# Altium footprint library Footprints.PcbLib: 67 footprints (part 2 of 5)
Each footprint in its own frame and in the unit in brackets; x right, y up, seen from the top. Pads: shape width x height; smd on the part's side, far side on the other; paste and mask are expansions set on the pad; w line width, h text height; cw(c..) or ccw(c..) is an arc to the next point about the centre after c.
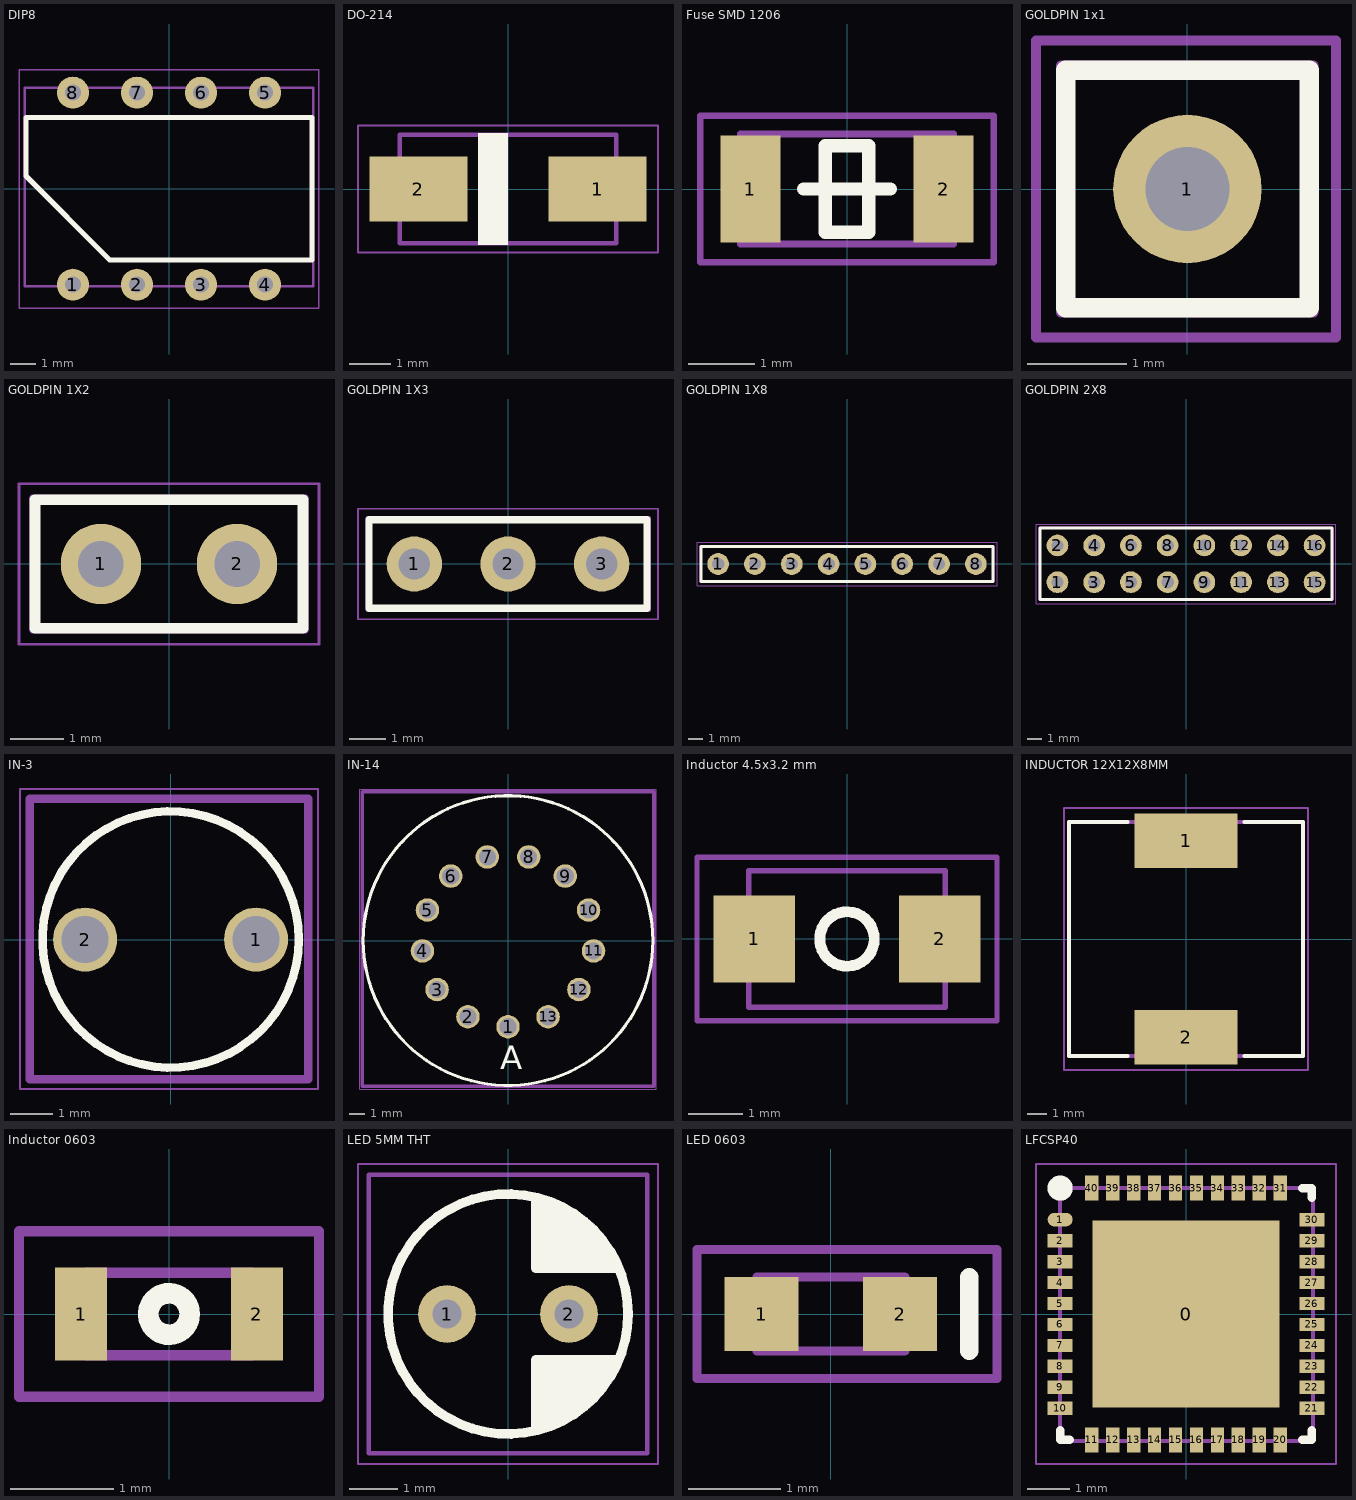
[diagram p1: the footprints below, top view; thin cyan lines are the x and y axes]

## DIP8 [mm]
pads (8):
  round 1.27 hole 0.635: 1(-3.81,-3.81) 2(-1.27,-3.81) 3(1.27,-3.81) 4(3.81,-3.81) 5(3.81,3.81) 6(1.27,3.81) 7(-1.27,3.81) 8(-3.81,3.81)
Top Overlay:
  lines w0.2: -5.675,0.5 -2.35,-2.825 5.675,-2.825 5.675,2.825 -5.675,2.825 -5.675,0.5
Placement:
  lines w0.1: -5.725,-3.875 -5.725,4 5.725,4 5.725,-3.875 -5.725,-3.875
  text "'.Designator'" at -4.8,0.6 h1.2
Keep-Out:
  lines w0.05: -5.95,-4.75 5.95,-4.75 5.95,4.725 -5.95,4.725 -5.95,-4.75
3D body "CircuitWorks-DIP8.step": height 4.19, standoff -2.67, extent -5.715,-3.874 5.715,4

## DO-214 [mm]
pads (2):
  rect 2.35x1.55 smd: 1(2.15,0) 2(-2.15,0)
Top Overlay:
  region: 0,1.35 -0.725,1.35 -0.725,-1.35 0,-1.35
Placement:
  lines w0.1: -2.598,-1.302 -2.598,1.302 2.598,1.302 2.598,-1.302 -2.598,-1.302
  text ".Designator" at -2.15,-0.4 h1.2
Keep-Out:
  lines w0.05: -3.6,-1.525 -3.6,1.525 3.6,1.525 3.6,-1.525 -3.6,-1.525
3D body "S1M-13-F.stp": height 2.4, standoff 0, extent -2.598,-1.302 2.598,1.302

## Fuse SMD 1206 [mm]
pads (2):
  rect 0.9x1.6 smd: 1(-1.45,0) 2(1.45,0)
Top Overlay:
  lines w0.2: -0.65,0 0,0 0.65,0 ; -0.325,-0.65 0.325,-0.65 0.325,0 0.325,0.65 -0.325,0.65 -0.325,0 -0.325,-0.65
Placement:
  lines w0.1: -1.6,-0.825 1.6,-0.825 1.6,0.825 -1.6,0.825 -1.6,-0.825
  text "'.Designator'" at -1.225,-0.125 h0.45
Keep-Out:
  lines w0.1: -2.2,-1.1 -2.2,1.1 2.2,1.1 2.2,-1.1 -2.2,-1.1
3D body "User Library-nona SMD075F.step": height 0.56, standoff 0, extent -1.601,-0.826 1.601,0.826

## GOLDPIN 1x1 [mm]
pads (1):
  round 1.5 hole 0.85: 1(0,0)
Top Overlay:
  lines w0.2: -1.23,-1.2 1.23,-1.2 1.23,1.2 -1.23,1.2 -1.23,-1.2
Placement:
  lines w0.1: -1.28,-1.25 1.275,-1.25 1.275,1.25 -1.28,1.25 -1.28,-1.25
  text "'.Designator'" at -0.73,-0.3 h0.9
Keep-Out:
  lines w0.1: -1.53,-1.5 -1.53,1.5 1.5,1.5 1.5,-1.5 -1.53,-1.5
3D body "User Library-Header Vertical 2_54mm Pitch2-1.step": height 5.94, standoff -2.94, extent -1.27,-1.27 1.27,1.27

## GOLDPIN 1X2 [mm]
pads (2):
  round 1.5 hole 0.85: 1(-1.27,0) 2(1.27,0)
Top Overlay:
  lines w0.2: -2.5,-1.2 2.5,-1.2 2.5,1.2 -2.5,1.2 -2.5,-1.2
Placement:
  lines w0.1: -2.55,-1.25 2.55,-1.25 2.55,1.25 -2.55,1.25 -2.55,-1.25
  text "'.Designator'" at -2,-0.3 h0.9
Keep-Out:
  lines w0.05: -2.8,-1.5 -2.8,1.5 2.8,1.5 2.8,-1.5 -2.8,-1.5
3D body "User Library-Header Vertical 2_54mm Pitch2-1.step": height 5.94, standoff -2.94, extent 0,-1.27 2.54,1.27
3D body "User Library-Header Vertical 2_54mm Pitch2-1.step": height 5.94, standoff -2.94, extent -2.54,-1.27 0,1.27

## GOLDPIN 1X3 [mm]
pads (3):
  round 1.5 hole 0.85: 1(-2.54,0) 2(0,0) 3(2.54,0)
Top Overlay:
  lines w0.2: -3.77,-1.2 3.77,-1.2 3.77,1.2 -3.77,1.2 -3.77,-1.2
Placement:
  lines w0.1: -3.82,-1.25 3.825,-1.25 3.825,1.25 -3.82,1.25 -3.82,-1.25
  text "'.Designator'" at -3.27,-0.3 h0.9
Keep-Out:
  lines w0.05: -4.07,-1.5 -4.07,1.5 4.07,1.5 4.07,-1.5 -4.07,-1.5
3D body "User Library-Header Vertical 2_54mm Pitch2-1.step": height 5.94, standoff -2.94, extent -1.27,-1.27 1.27,1.27
3D body "User Library-Header Vertical 2_54mm Pitch2-1.step": height 5.94, standoff -2.94, extent -3.81,-1.27 -1.27,1.27
3D body "User Library-Header Vertical 2_54mm Pitch2-1.step": height 5.94, standoff -2.94, extent 1.27,-1.27 3.81,1.27

## GOLDPIN 1X8 [mm]
pads (8):
  round 1.5 hole 0.85: 1(-8.89,0) 2(-6.35,0) 3(-3.81,0) 4(-1.27,0) 5(1.27,0) 6(3.81,0) 7(6.35,0) 8(8.89,0)
Top Overlay:
  lines w0.2: -10.075,-1.2 -10.075,1.2 10.075,1.2 10.075,-1.2 -10.075,-1.2
Placement:
  lines w0.1: -10.125,-1.25 -10.125,1.25 10.125,1.25 10.125,-1.25 -10.125,-1.25
  text "'.Designator'" at -2,-0.3 h0.9
Keep-Out:
  lines w0.05: -10.35,-1.5 10.35,-1.5 10.35,1.5 -10.35,1.5 -10.35,-1.5
3D body "User Library-Header Vertical 2_54mm Pitch2-1.step": height 5.94, standoff -2.94, extent 2.54,-1.27 5.08,1.27
3D body "User Library-Header Vertical 2_54mm Pitch2-1.step": height 5.94, standoff -2.94, extent -2.54,-1.27 0,1.27
3D body "User Library-Header Vertical 2_54mm Pitch2-1.step": height 5.94, standoff -2.94, extent 0,-1.27 2.54,1.27
3D body "User Library-Header Vertical 2_54mm Pitch2-1.step": height 5.94, standoff -2.94, extent -5.08,-1.27 -2.54,1.27
3D body "User Library-Header Vertical 2_54mm Pitch2-1.step": height 5.94, standoff -2.94, extent -7.62,-1.27 -5.08,1.27
3D body "User Library-Header Vertical 2_54mm Pitch2-1.step": height 5.94, standoff -2.94, extent -10.16,-1.27 -7.62,1.27
3D body "User Library-Header Vertical 2_54mm Pitch2-1.step": height 5.94, standoff -2.94, extent 5.08,-1.27 7.62,1.27
3D body "User Library-Header Vertical 2_54mm Pitch2-1.step": height 5.94, standoff -2.94, extent 7.62,-1.27 10.16,1.27

## GOLDPIN 2X8 [mm]
pads (16):
  round 1.5 hole 0.85: 1(-8.89,-1.27) 2(-8.89,1.27) 3(-6.35,-1.27) 4(-6.35,1.27) 5(-3.81,-1.27) 6(-3.81,1.27) 7(-1.27,-1.27) 8(-1.27,1.27) 9(1.27,-1.27) 10(1.27,1.27) 11(3.81,-1.27) 12(3.81,1.27) 13(6.35,-1.27) 14(6.35,1.27) 15(8.89,-1.27) 16(8.89,1.27)
Top Overlay:
  lines w0.2: -10.1,-2.47 -10.1,2.475 10.1,2.475 10.1,-2.47 -10.1,-2.47
Placement:
  lines w0.1: -10.15,-2.52 -10.15,2.525 10.15,2.525 10.15,-2.52 -10.15,-2.52
  text "'.Designator'" at -4.8,-0.35 h0.9
Keep-Out:
  lines w0.05: -10.375,-2.77 10.375,-2.77 10.375,2.75 -10.375,2.75 -10.375,-2.77
3D body "User Library-Header Vertical 2_54mm Pitch2-1.step": height 5.94, standoff -2.94, extent -2.54,-2.54 0,0
3D body "User Library-Header Vertical 2_54mm Pitch2-1.step": height 5.94, standoff -2.94, extent 0,-2.54 2.54,0
3D body "User Library-Header Vertical 2_54mm Pitch2-1.step": height 5.94, standoff -2.94, extent -5.08,-2.54 -2.54,0
3D body "User Library-Header Vertical 2_54mm Pitch2-1.step": height 5.94, standoff -2.94, extent -7.62,-2.54 -5.08,0
3D body "User Library-Header Vertical 2_54mm Pitch2-1.step": height 5.94, standoff -2.94, extent -2.54,0 0,2.54
3D body "User Library-Header Vertical 2_54mm Pitch2-1.step": height 5.94, standoff -2.94, extent 0,0 2.54,2.54
3D body "User Library-Header Vertical 2_54mm Pitch2-1.step": height 5.94, standoff -2.94, extent -5.08,0 -2.54,2.54
3D body "User Library-Header Vertical 2_54mm Pitch2-1.step": height 5.94, standoff -2.94, extent -7.62,0 -5.08,2.54
3D body "User Library-Header Vertical 2_54mm Pitch2-1.step": height 5.94, standoff -2.94, extent -10.16,-2.54 -7.62,0
3D body "User Library-Header Vertical 2_54mm Pitch2-1.step": height 5.94, standoff -2.94, extent -10.16,0 -7.62,2.54
3D body "User Library-Header Vertical 2_54mm Pitch2-1.step": height 5.94, standoff -2.94, extent 2.54,-2.54 5.08,0
3D body "User Library-Header Vertical 2_54mm Pitch2-1.step": height 5.94, standoff -2.94, extent 2.54,0 5.08,2.54
3D body "User Library-Header Vertical 2_54mm Pitch2-1.step": height 5.94, standoff -2.94, extent 5.08,-2.54 7.62,0
3D body "User Library-Header Vertical 2_54mm Pitch2-1.step": height 5.94, standoff -2.94, extent 5.08,0 7.62,2.54
3D body "User Library-Header Vertical 2_54mm Pitch2-1.step": height 5.94, standoff -2.94, extent 7.62,-2.54 10.16,0
3D body "User Library-Header Vertical 2_54mm Pitch2-1.step": height 5.94, standoff -2.94, extent 7.62,0 10.16,2.54

## IN-3 [mm]
pads (2):
  round 1.5 hole 1.1: 1(2,0) 2(-2,0)
Top Overlay:
  circle w0.2: c0,0 r3
Placement:
  lines w0.2: -3.3,-3.275 3.225,-3.275 3.225,3.3 -3.3,3.3 -3.3,-3.275
  text "'.Designator'" at -2,0 h1.2
Keep-Out:
  lines w0.05: -3.525,-3.5 -3.525,3.525 3.45,3.525 3.45,-3.5 -3.525,-3.5

## IN-14 [mm]
pads (13):
  round 1.5 hole 1.1: 1(0,-5.5) 2(-2.556,-4.87) 3(-4.526,-3.124) 4(-5.46,-0.663) 5(-5.143,1.95) 6(-3.647,4.117) 7(-1.317,5.34) 8(1.317,5.34) 9(3.647,4.117) 10(5.143,1.95) 11(5.46,-0.663) 12(4.526,-3.124) 13(2.556,-4.87)
Top Overlay:
  circle w0.2: c0,0 r9.25
  text "A" at -0.5,-8.225 h1.52
Placement:
  lines w0.2: -9.3,-9.3 -9.3,9.5 9.3,9.5 9.3,-9.3 -9.3,-9.3
  text "'.Designator'" at -7,-1 h1.8
Keep-Out:
  lines w0.05: -9.475,-9.4 -9.475,9.675 ; -9.475,9.675 -9.475,-9.475 9.475,-9.475 9.475,9.675 -9.475,9.675
3D body "User Library-IN-14.step": height 59.61, standoff -3, extent -9.3,-9.3 9.3,9.5

## Inductor 4.5x3.2 mm [mm]
pads (2):
  rect 1.5x1.6 smd: 1(-1.7,0) 2(1.7,0)
Top Overlay:
  circle w0.2: c0,0 r0.5
Placement:
  lines w0.1: -1.8,-1.25 1.8,-1.25 1.8,1.25 -1.8,1.25 -1.8,-1.25
  text "'.Designator'" at -1.45,-0.25 h0.6
Keep-Out:
  lines w0.1: -2.75,-1.5 -2.75,1.5 2.75,1.5 2.75,-1.5 -2.75,-1.5
3D body "CC453232A-102KL.stp": height 2.3, standoff 0, extent -1.796,-1.25 1.796,1.25

## INDUCTOR 12X12X8MM [mm]
pads (2):
  rect 5.3x2.8 smd: 1(0,5.05) 2(0,-5.05)
Top Overlay:
  lines w0.2: -3,-6 -6,-6 -6,6 -3,6 ; 3,-6 6,-6 6,6 3,6
Placement:
  lines w0.2: -6,-6 -6,6 6,6 6,-6 -6,-6
  text ".Designator" at -4,0 h1.2
Keep-Out:
  lines w0.1: -6.274,-6.731 -6.274,6.731 6.274,6.731 6.274,-6.731 -6.274,-6.731
3D body "User Library-SRR1210_inductor.STEP": height 10.43, standoff 0.07, extent -6,-6 6,6

## Inductor 0603 [mm]
pads (2):
  rect 0.5x0.9 smd: 1(-0.85,0) 2(0.85,0)
Top Overlay:
  circle w0.2: c0,0 r0.2
Placement:
  lines w0.1: -0.8,-0.4 0.8,-0.4 0.8,0.4 -0.8,0.4 -0.8,-0.4
  text "'.Designator'" at -0.225,-0.025 h0.3
Keep-Out:
  lines w0.1: -1.45,-0.8 -1.45,0.8 -0.675,0.8 1.45,0.8 1.45,-0.8 -1.45,-0.8
3D body "User Library-Chip Inductor.step": height 0.95, standoff 0, extent -0.8,-0.4 0.8,0.4

## LED 5MM THT [mm]
pads (2):
  round 1.2 hole 0.6: 1(-1.27,0) 2(1.27,0)
Top Overlay:
  circle w0.2: c0,0 r2.5
  lines w0.2: 0.575,-2.4 0.575,-0.95 ; 0.575,-1.996 1.319,-1.996 ; 0.575,-1.905 1.434,-1.905 ; 0.575,-1.473 0.768,-1.28 2.062,-1.28 0.646,-1.28 ; 0.575,-1.445 1.908,-1.445 ; 0.575,1.445 1.908,1.445 ; 0.575,1.473 0.768,1.28 2.062,1.28 0.646,1.28 ; 0.575,1.905 1.434,1.905 ; 0.575,1.996 1.319,1.996 ; 0.575,2.4 0.575,0.95 ; 0.581,-1.802 1.581,-1.802 ; 0.581,1.802 1.581,1.802 ; 0.7,-1.607 1.823,-1.607 ; 0.7,1.607 1.823,1.607 ; 0.764,-1.699 1.764,-1.699 ; 0.764,1.699 1.764,1.699 ; 0.963,-2.223 0.656,-2.223 0.759,-2.12 1.154,-2.12 ; 0.963,2.223 0.656,2.223 0.759,2.12 1.154,2.12 ; 2.165,-1.124 0.749,-1.124 0.575,-0.95 ; 2.165,1.124 0.749,1.124 0.575,0.95 ; 2.275,-0.95 0.575,-0.95 ; 2.275,0.95 0.575,0.95
Placement:
  lines w0.1: -2.9,-2.9 -2.9,2.9 2.9,2.9 2.9,-2.9 -2.9,-2.9
  text "'.Designator'" at -2.525,1.275 h0.6
Keep-Out:
  lines w0.05: -3.125,-3.125 3.125,-3.125 3.125,3.125 -3.125,3.125 -3.125,-3.125
3D body "User Library-White LED 5mm Straight.step": height 28.5, standoff -7.5, extent -2.9,-2.9 2.9,2.9

## LED 0603 [mm]
pads (2):
  rect 0.8x0.8 smd: 1(-0.75,0) 2(0.75,0)
Top Overlay:
  lines w0.2: 1.5,-0.4 1.5,0.4
Placement:
  lines w0.1: -0.8,-0.4 0.8,-0.4 0.8,0.4 -0.8,0.4 -0.8,-0.4
  text "'.Designator'" at -0.225,-0.025 h0.3
Keep-Out:
  lines w0.1: -1.45,-0.7 -1.45,0.7 -0.675,0.7 1.8,0.7 1.8,-0.7 -1.45,-0.7
3D body "User Library-SMD LED 0603.step": height 0.38, standoff -0.01, extent -0.8,-0.4 0.8,0.4

## LFCSP40 [mm]
pads (41):
  rect 4.45x4.45 smd: 0(0,0)
  oval 0.6x0.32 smd: 1(-3,2.25)
  rect 0.6x0.32 smd: 2(-3,1.75) 3(-3,1.25) 4(-3,0.75) 5(-3,0.25) 6(-3,-0.25) 7(-3,-0.75) 8(-3,-1.25) 9(-3,-1.75) 10(-3,-2.25) 21(3,-2.25) 22(3,-1.75) 23(3,-1.25) 24(3,-0.75) 25(3,-0.25) 26(3,0.25) 27(3,0.75) 28(3,1.25) 29(3,1.75) 30(3,2.25)
  rect 0.32x0.6 smd: 11(-2.25,-3) 12(-1.75,-3) 13(-1.25,-3) 14(-0.75,-3) 15(-0.25,-3) 16(0.25,-3) 17(0.75,-3) 18(1.25,-3) 19(1.75,-3) 20(2.25,-3) 31(2.25,3) 32(1.75,3) 33(1.25,3) 34(0.75,3) 35(0.25,3) 36(-0.25,3) 37(-0.75,3) 38(-1.25,3) 39(-1.75,3) 40(-2.25,3)
Top Overlay:
  circle w0.3: c-3,3 r0.15
  lines w0.2: -3,-2.775 -3,-3 -2.775,-3 ; 2.775,-3 3,-3 3,-2.775 ; 2.775,3 3,3 3,2.775
Placement:
  lines w0.1: -3,-3.025 -3,3 3.025,3 3.025,-3.025 -3,-3.025
  text "'.Designator'" at -2.35,-0.05 h0.9
Keep-Out:
  lines w0.05: -3.575,-3.575 -3.575,3.575 3.575,3.575 3.575,-3.575 -3.575,-3.575
3D body "User Library-LFCSP-40.STEP": height 1.01, standoff -0.08, extent -3,-3.02 3.02,3